# Altium footprint library BARKO_PCBLIB.PcbLib: 531 footprints (part 9 of 34)
Each footprint in its own frame and in the unit in brackets; x right, y up, seen from the top. Pads: shape width x height; smd on the part's side, far side on the other; paste and mask are expansions set on the pad; w line width, h text height; cw(c..) or ccw(c..) is an arc to the next point about the centre after c.
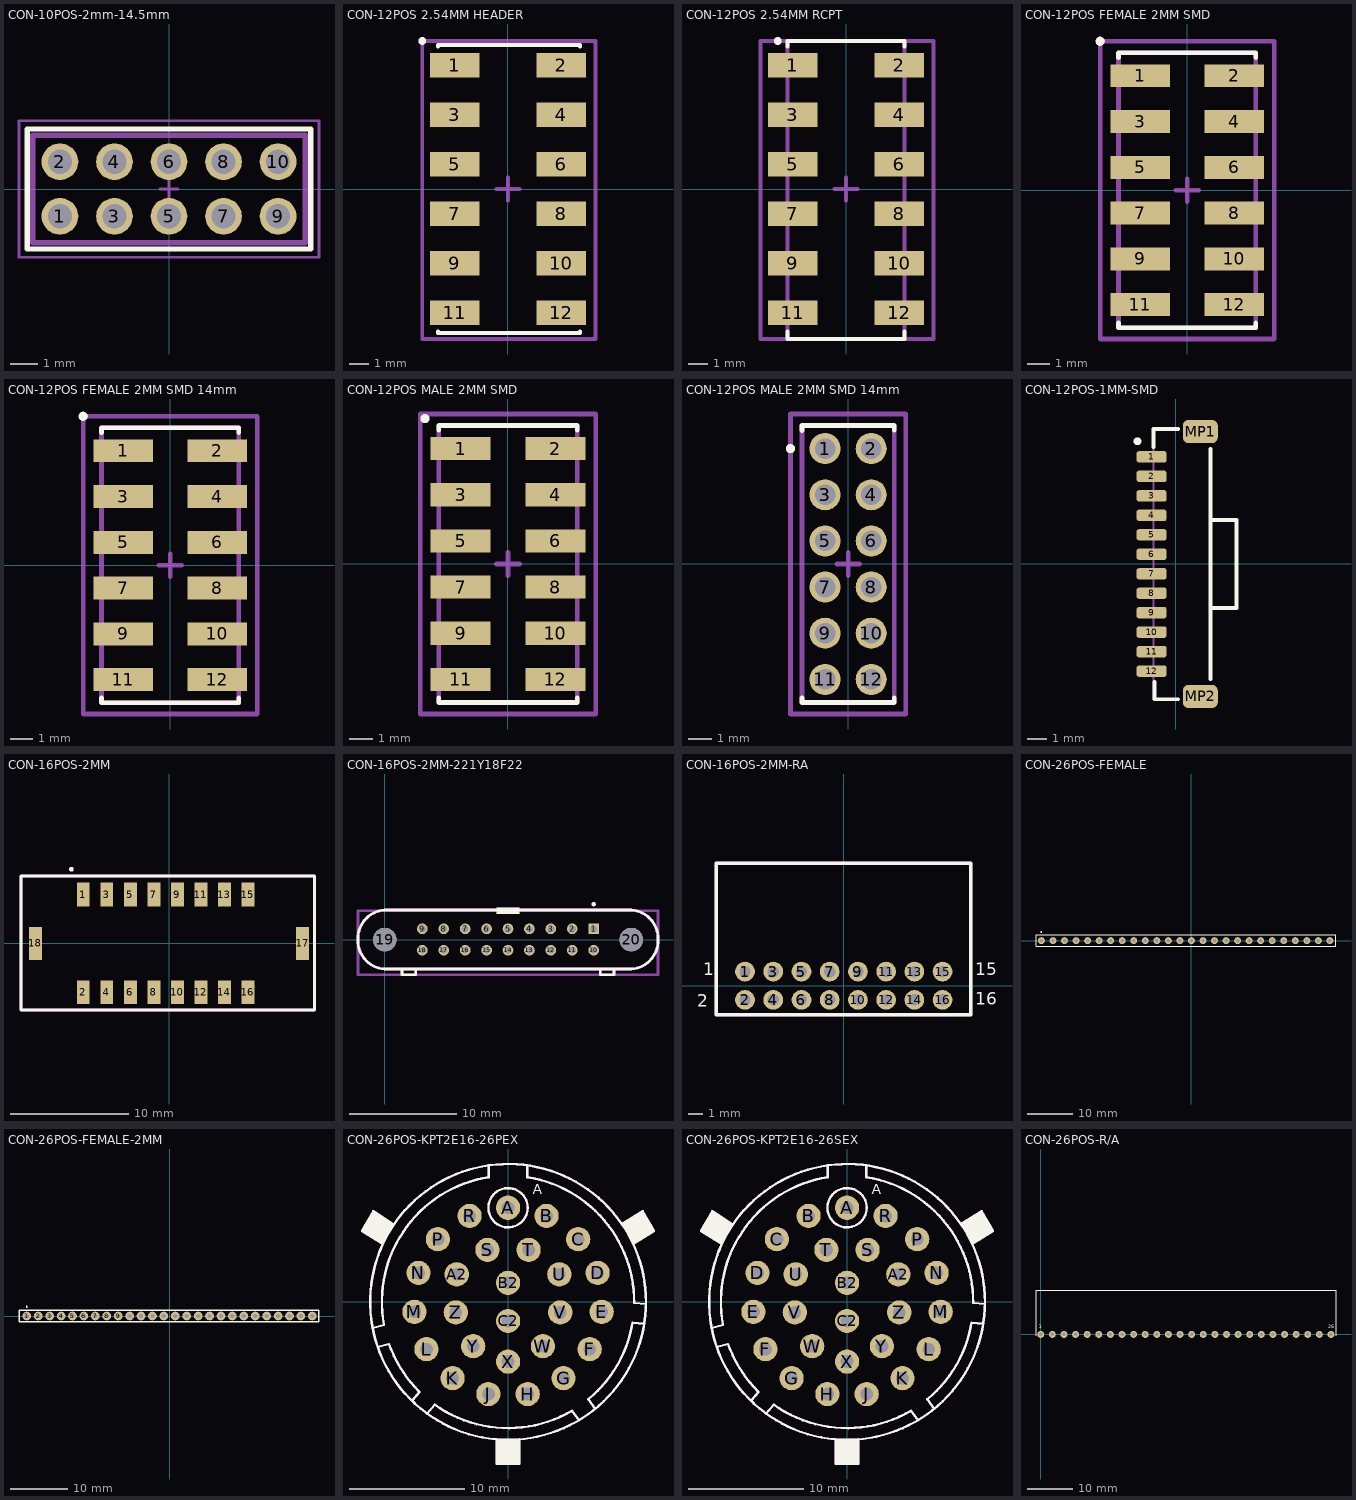
[diagram p8: the footprints below, top view; thin cyan lines are the x and y axes]

## CON-10POS-2mm-14.5mm [mil]
pads (10):
  round 53 hole 35 mask+3: 1(-157.48,-39.37) 2(-157.48,39.37) 3(-78.74,-39.37) 4(-78.74,39.37) 5(0,-39.37) 6(0,39.37) 7(78.74,-39.37) 8(78.74,39.37) 9(157.48,-39.37) 10(157.48,39.37)
Top Overlay:
  lines w7.87: -204.72,-86.61 -204.72,86.61 204.72,86.61 204.72,-86.61 -204.72,-86.61
Mechanical 15:
  lines w3.94: -12.87,0 12.87,0 ; 0,-12.87 0,12.87 ; -216.54,-98.43 -216.54,98.43 216.54,98.43 216.54,-98.43 -216.54,-98.43
ASM Top:
  lines w7.87: -196.85,-77.5 -196.85,77.5 196.85,77.5 196.85,-77.5 -196.85,-77.5
  text ".designator" at -3.94,0 h47.24
3D body "MTMM-105-14-L-D-571.stp": height 630.5, standoff -120.5, extent -196.86,-77.5 196.84,77.5

## CON-12POS 2.54MM HEADER [mm]
pads (12):
  rect 2.54x1.27 smd paste-0.05: 1(-2.73,6.35) 2(2.73,6.35) 3(-2.73,3.81) 4(2.73,3.81) 5(-2.73,1.27) 6(2.73,1.27) 7(-2.73,-1.27) 8(2.73,-1.27) 9(-2.73,-3.81) 10(2.73,-3.81) 11(-2.73,-6.35) 12(2.73,-6.35)
Top Overlay:
  circle w0.2: c-4.4,7.6 r0.1
  lines w0.2: -3.6,-7.3 -3.6,-7.4 3.7,-7.4 3.7,-7.3 ; -3.6,7.3 -3.6,7.4 ; -3.6,7.35 -3.6,7.4 ; 3.7,7.3 3.7,7.4 -3.6,7.4
Mechanical 15:
  lines w0.2: -0.6,0 0,0 ; 0,-0.6 0,0 ; 0,0.6 0,0 ; 0.6,0 0,0 ; -4.4,-7.7 -4.4,7.6 4.5,7.6 4.5,-7.7 -4.4,-7.7
ASM Top:
  lines w0.2: -4.4,-7.7 -4.4,7.6 4.5,7.6 4.5,-7.7 -4.4,-7.7
  text ".designator" at 0.2,-2.1 h0.8
3D body "95278_y01_12_asm.stp": height 9.67, standoff 0.01, extent -3.6,-7.42 3.686,7.42

## CON-12POS 2.54MM RCPT [mm]
pads (12):
  rect 2.54x1.27 smd paste-0.05: 1(-2.73,6.35) 2(2.73,6.35) 3(-2.73,3.81) 4(2.73,3.81) 5(-2.73,1.27) 6(2.73,1.27) 7(-2.73,-1.27) 8(2.73,-1.27) 9(-2.73,-3.81) 10(2.73,-3.81) 11(-2.73,-6.35) 12(2.73,-6.35)
Top Overlay:
  circle w0.2: c-3.5,7.6 r0.1
  lines w0.2: -3,-7.3 -3,-7.7 3,-7.7 3,-7.3 ; -3,7.3 -3,7.6 3,7.6 3,7.3
Mechanical 15:
  lines w0.2: -0.6,0 0,0 ; 0,-0.6 0,0 ; 0,0.6 0,0 ; 0.6,0 0,0 ; -4.4,-7.7 4.5,-7.7 4.5,7.6 -4.4,7.6 -4.4,-7.7
ASM Top:
  circle w0.2: c-3.5,7.6 r0.1
  lines w0.2: -3,-7.7 3,-7.7 3,7.6 -3,7.6 -3,-7.7
  text ".designator" at 0.2,-2.1 h0.8
3D body "89898-306a_asm.stp": height 8.21, standoff 0.01, extent -3.016,-7.63 3.016,7.53

## CON-12POS FEMALE 2MM SMD [mm]
pads (12):
  rect 2.6x1 smd: 1(-2.05,5) 2(2.05,5) 3(-2.05,3) 4(2.05,3) 5(-2.05,1) 6(2.05,1) 7(-2.05,-1) 8(2.05,-1) 9(-2.05,-3) 10(2.05,-3) 11(-2.05,-5) 12(2.05,-5)
Top Overlay:
  circle w0.2: c-3.799,6.507 r0.1
  lines w0.2: -3,-5.8 -3,-6 -2.15,-6 3,-6 3,-5.8 ; -3,5.8 -3,6 2.15,6 3,6 3,5.8
Mechanical 15:
  lines w0.2: -0.5,0 0.5,0 ; 0,-0.5 0,0.5 ; -3.8,-6.5 -3.8,6.5 3.8,6.5 3.8,-6.5 -3.8,-6.5
ASM Top:
  lines w0.2: -3,-6 3,-6 3,6 -3,6 -3,-6
  text ".designator" at -0.1,-0.1 h0.8
3D body "55510-x12_asm.stp": height 5.59, standoff 0.19, extent -3,-5.96 3,5.96

## CON-12POS FEMALE 2MM SMD 14mm [mm]
pads (12):
  rect 2.6x1 smd: 1(-2.05,5) 2(2.05,5) 3(-2.05,3) 4(2.05,3) 5(-2.05,1) 6(2.05,1) 7(-2.05,-1) 8(2.05,-1) 9(-2.05,-3) 10(2.05,-3) 11(-2.05,-5) 12(2.05,-5)
Top Overlay:
  circle w0.2: c-3.799,6.507 r0.1
  lines w0.2: -3,-5.8 -3,-6 -2.15,-6 3,-6 3,-5.8 ; -3,5.8 -3,6 2.15,6 3,6 3,5.8
Mechanical 15:
  lines w0.2: -0.5,0 0.5,0 ; 0,-0.5 0,0.5 ; -3.8,-6.5 -3.8,6.5 3.8,6.5 3.8,-6.5 -3.8,-6.5
ASM Top:
  lines w0.2: -3,-6 3,-6 3,6 -3,6 -3,-6
  text ".designator" at -0.1,-0.1 h0.8
3D body "c-1-2314844-2-5-3d.stp": height 4.63, standoff -0.05, extent -3.33,-6 3.33,6

## CON-12POS MALE 2MM SMD [mm]
pads (12):
  rect 2.6x1 smd: 1(-2.05,5) 2(2.05,5) 3(-2.05,3) 4(2.05,3) 5(-2.05,1) 6(2.05,1) 7(-2.05,-1) 8(2.05,-1) 9(-2.05,-3) 10(2.05,-3) 11(-2.05,-5) 12(2.05,-5)
Top Overlay:
  circle w0.2: c-3.599,6.3 r0.1
  lines w0.2: -3,-5.8 -3,-6 -2.15,-6 3,-6 3,-5.8 ; -3,5.8 -3,6 2.15,6 3,6 3,5.8
Mechanical 15:
  lines w0.2: -0.5,0 0.5,0 ; 0,-0.5 0,0.5 ; -3.8,-6.5 -3.8,6.5 3.8,6.5 3.8,-6.5 -3.8,-6.5
ASM Top:
  lines w0.2: -3,-6 3,-6 3,6 -3,6 -3,-6
  text ".designator" at -0.1,-0.1 h0.8
3D body "57202-G52-06LFc.stp": height 6.51, standoff 0.01, extent -3.002,-6 3.003,6

## CON-12POS MALE 2MM SMD 14mm [mil]
pads (12):
  round 53 hole 35 mask+3: 1(-39.37,196.85) 2(39.37,196.85) 3(-39.37,118.11) 4(39.37,118.11) 5(-39.37,39.37) 6(39.37,39.37) 7(-39.37,-39.37) 8(39.37,-39.37) 9(-39.37,-118.11) 10(39.37,-118.11) 11(-39.37,-196.85) 12(39.37,-196.85)
Top Overlay:
  circle w7.87: c-98.43,196.85 r3.94
  lines w7.87: -78.74,-228.35 -78.74,-236.22 78.74,-236.22 78.74,-228.35 ; -78.74,227.12 -78.74,235 ; -78.74,236.22 78.74,236.22 78.74,228.35
Mechanical 15:
  lines w7.87: -19.68,0 19.68,0 ; 0,-19.68 0,19.68 ; -98.43,-255.91 -98.43,255.9 98.43,255.9 98.43,-255.91 -98.43,-255.91
ASM Top:
  lines w7.87: -78.74,-236.22 78.74,-236.22 78.74,236.22 -78.74,236.22 -78.74,-236.22
  text ".designator" at -3.94,-3.94 h31.5
3D body "MTMM-106-14-T-D-570.stp": height 629.5, standoff -121.5, extent -77.49,-236.21 77.51,236.23

## CON-12POS-1MM-SMD [mm]
pads (14):
  rrect50% 1.55x0.6 smd mask+0.05: 1(-1.25,5.5) 2(-1.25,4.5) 3(-1.25,3.5) 4(-1.25,2.5) 5(-1.25,1.5) 6(-1.25,0.5) 7(-1.25,-0.5) 8(-1.25,-1.5) 9(-1.25,-2.5) 10(-1.25,-3.5) 11(-1.25,-4.5) 12(-1.25,-5.5)
  rrect50% 1.8x1.2 smd mask+0.05: MP1(1.25,6.8) MP2(1.25,-6.8)
Top Overlay:
  circle w0.2: c-1.98,6.3 r0.1
  lines w0.2: -1.16,6.01 -1.16,6.931 0.1,6.931 ; -1.102,-6.048 -1.102,-6.941 0.1,-6.941 ; 1.781,-5.9 1.781,-2.25 ; 1.781,5.9 1.781,2.25 ; 1.781,-2.25 3.11,-2.25 3.11,2.25 1.781,2.25 ; 1.781,-2.25 1.781,-2.25 ; 1.781,-2.25 1.781,2.25
ASM Top:
  lines w0.1: 0.1,-6.941 -1.16,-6.941 -1.16,6.01 -1.16,6.931 0.1,6.931 ; 1.781,-2.25 3.11,-2.25 ; 1.781,2.25 3.11,2.25 3.11,-2.25 ; 1.781,5.9 1.781,-5.9 ; 1.781,-5.9 1.781,-5.9 ; 3.11,-2.25 3.11,-2.25
  text ".designator" at 0.1,0 h0.8
3D body "5013311207.stp": height 5.5, standoff -0.04, extent -1.76,-7.12 3.59,7.12

## CON-16POS-2MM [mm]
pads (18):
  rect 1.1x2 smd: 1(-7.29,4.15) 2(-7.29,-4.15) 3(-5.29,4.15) 4(-5.29,-4.15) 5(-3.29,4.15) 6(-3.29,-4.15) 7(-1.29,4.15) 8(-1.29,-4.15) 9(0.71,4.15) 10(0.71,-4.15) 11(2.71,4.15) 12(2.71,-4.15) 13(4.71,4.15) 14(4.71,-4.15) 15(6.71,4.15) 16(6.71,-4.15)
  rect 1.1x2.8 smd: 17(11.35,0) 18(-11.35,0)
Top Overlay:
  circle w0.2: c-8.299,6.3 r0.1
  lines w0.254: -12.573,-5.664 -12.573,5.715 12.37,5.715 12.37,-5.664 -12.573,-5.664
ASM Top:
  lines w0.254: -12.573,-5.664 -12.573,5.715 12.37,5.715 12.37,-5.664 -12.573,-5.664
  text ".designator" at -8.001,-0.178 h0.8
3D body "DF11G-16DP-2V.stp": height 7.16, standoff -1.04, extent -12.118,-4.496 11.582,4.704

## CON-16POS-2MM-221Y18F22 [mm] "Nicomatic 221Y18F22"
height 5.6
pads (20):
  rect 1x1 hole 0.65: 1(19.5,1)
  round 1 hole 0.65: 2(17.5,1) 3(15.5,1) 4(13.5,1) 5(11.5,1) 6(9.5,1) 7(7.5,1) 8(5.5,1) 9(3.5,1) 10(19.5,-1) 11(17.5,-1) 12(15.5,-1) 13(13.5,-1) 14(11.5,-1) 15(9.5,-1) 16(7.5,-1) 17(5.5,-1) 18(3.5,-1)
  round 2.2 hole 2.2 unplated: 19(0,0) 20(23,0)
Top Overlay:
  circle w0.2: c19.501,3.3 r0.1
  rectangle: 10.438,2.4 12.585,3
  lines w0.254: 1.6,-2.75 1.6,-3.3 2.9,-3.3 2.9,-2.75 ; 20.1,-2.75 20.1,-3.3 21.4,-3.3 21.4,-2.75 ; -2.5,0 ccw(c0.125,-0.125) 0,-2.75 23,-2.75 ccw(c22.875,-0.125) 25.5,0 ccw(c22.875,0.125) 23,2.75 0,2.75 ccw(c0.125,0.125) -2.5,0
Mechanical 15:
  lines w0.254: -2.5,-3.3 -2.5,2.7 25.5,2.7 25.5,-3.3 -2.5,-3.3
ASM Top:
  rectangle: 10.438,2.4 12.585,3
  lines w0.254: 1.6,-2.75 1.6,-3.3 2.9,-3.3 2.9,-2.75 ; 20.1,-2.75 20.1,-3.3 21.4,-3.3 21.4,-2.75 ; -2.5,0 cw(c0.125,0.125) 0,2.75 23,2.75 cw(c22.875,0.125) 25.5,0 cw(c22.875,-0.125) 23,-2.75 0,-2.75 cw(c0.125,-0.125) -2.5,0
  text ".designator" at 9.1,-0.2 h0.8
3D body "221Y18F22.STEP": height 5.8, standoff -4.8, extent -2.499,-3.271 25.501,2.729

## CON-16POS-2MM-RA [mm]
pads (16):
  round 1.4 hole 0.8: 1(-7,1) 2(-7,-1) 3(-5,1) 4(-5,-1) 5(-3,1) 6(-3,-1) 7(-1,1) 8(-1,-1) 9(1,1) 10(1,-1) 11(3,1) 12(3,-1) 13(5,1) 14(5,-1) 15(7,1) 16(7,-1)
Top Overlay:
  lines w0.254: -9.032,-2.048 9.002,-2.048 9.002,8.671 -9.032,8.671 -9.032,-2.048
  text "1" at -9.946,0.416 h1.52
  text "2" at -10.404,-1.794 h1.52
  text "15" at 9.332,0.416 h1.52
  text "16" at 9.332,-1.667 h1.52
ASM Top:
  lines w0.254: -9.032,-2.048 -9.032,8.671 9.002,8.671 9.002,-2.048 -9.032,-2.048
  text ".designator" at -7.889,3.134 h0.8
3D body "DF11-16DPOS-2DS-RA.stp": height 5.16, standoff -2.84, extent -9.007,-1.337 8.993,8.663

## CON-26POS-FEMALE [mil]
pads (26):
  round 60 hole 30: 1(-1300,0) 2(-1200,0) 3(-1100,0) 4(-1000,0) 5(-900,0) 6(-800,0) 7(-700,0) 8(-600,0) 9(-500,0) 10(-400,0) 11(-300,0) 12(-200,0) 13(-100,0) 14(0,0) 15(100,0) 16(200,0) 17(300,0) 18(400,0) 19(500,0) 20(600,0) 21(700,0) 22(800,0) 23(900,0) 24(1000,0) 25(1100,0) 26(1200,0)
Top Overlay:
  circle w7.87: c-1300,74.8 r3.94
  lines w10: -1347.24,-50 -1347.24,50 1252.76,50 1252.76,-50 -1347.24,-50
3D body "SS-126-TT-2.stp": height 175.87, standoff -124.13, extent -1347.24,-50 1252.76,50

## CON-26POS-FEMALE-2MM [mil]
pads (26):
  round 60 hole 30: 1(-984.25,0) 2(-905.51,0) 3(-826.77,0) 4(-748.03,0) 5(-669.29,0) 6(-590.55,0) 7(-511.81,0) 8(-433.07,0) 9(-354.33,0) 10(-275.59,0) 11(-196.85,0) 12(-118.11,0) 13(-39.37,0) 14(39.37,0) 15(118.11,0) 16(196.85,0) 17(275.59,0) 18(354.33,0) 19(433.07,0) 20(511.81,0) 21(590.55,0) 22(669.29,0) 23(748.03,0) 24(826.77,0) 25(905.51,0) 26(984.25,0)
Top Overlay:
  circle w7.87: c-984.25,62.99 r3.94
  lines w10: -1038.04,-39.35 1030.15,-39.35 1030.15,39.35 -1038.04,39.35 -1038.04,-39.35
3D body "MMS-126-01-F-SV.stp": height 175, standoff -115, extent -1038.04,-39.35 1030.15,39.35

## CON-26POS-KPT2E16-26PEX [mm]
pads (26):
  round 2.1 hole 1.1: A(0,8.15) A2(-4.44,2.39) B(3.33,7.44) B2(0,1.65) C(6.07,5.43) C2(0,-1.65) D(7.75,2.51) E(8.1,-0.86) F(7.06,-4.09) G(4.8,-6.6) H(1.7,-7.97) J(-1.7,-7.97) K(-4.8,-6.6) L(-7.06,-4.09) M(-8.1,-0.86) N(-7.75,2.51) P(-6.07,5.43) R(-3.33,7.44) S(-1.78,4.5) T(1.78,4.5) U(4.44,2.39) V(4.52,-0.91) W(3.02,-3.83) X(0,-5.16) Y(-3.02,-3.83) Z(-4.52,-0.91)
Top Overlay:
  circle w0.2: c0,0 r11.934
  circle w0.2: c0,8.15 r1.7
  region: -0.994,-11.893 -0.994,-14.025 0.986,-14.025 0.994,-11.893
  region: 11.647,7.87 9.844,6.748 10.823,5.029 12.637,6.155
  region: -11.655,7.87 -12.645,6.155 -10.823,5.029 -9.89,6.679
  lines w0.2: -11.718,-2.254 -10.74,-1.992 ; -11.277,-3.906 -10.296,-3.644 ccw(c0,0) -7.655,-7.79 -8.308,-8.566 ; -10.823,5.029 -12.645,6.155 -11.655,7.87 -9.89,6.679 ; -10.733,-1.991 cw(c0.005,0) -1.66,10.794 -1.66,11.815 ; -6.997,-9.665 -6.345,-8.889 ccw(c0,0) 5.542,-9.41 ; -0.994,-11.893 -0.994,-14.025 0.986,-14.025 0.994,-11.893 ; 1.65,10.791 cw(c0,0) 10.916,-0.097 11.924,-0.185 ; 1.65,10.794 1.65,11.815 ; 5.541,-9.408 6.12,-10.238 ; 7.521,-9.257 6.941,-8.427 ccw(c0,0) 10.77,-1.789 ; 9.844,6.748 11.647,7.87 12.637,6.155 10.823,5.029 ; 10.767,-1.801 11.775,-1.889
  text "A" at 2.134,9.017 h1.5
ASM Top:
  circle w0.2: c0,8.15 r1.7
  circle w0.2: c0,0 r11.934
  region: -11.655,7.87 -12.645,6.155 -10.823,5.029 -9.89,6.679
  region: 11.647,7.87 9.844,6.748 10.823,5.029 12.637,6.155
  region: -0.994,-11.893 -0.994,-14.025 0.986,-14.025 0.994,-11.893
  lines w0.2: -11.718,-2.254 -10.74,-1.992 ; -11.277,-3.906 -10.296,-3.644 ccw(c0,0) -7.655,-7.79 -8.308,-8.566 ; -10.823,5.029 -12.645,6.155 -11.655,7.87 -9.89,6.679 ; -10.733,-1.991 cw(c0.005,0) -1.66,10.794 -1.66,11.815 ; -6.997,-9.665 -6.345,-8.889 ccw(c0,0) 5.542,-9.41 ; -0.994,-14.025 -0.994,-11.893 ; 0.986,-14.025 0.994,-11.893 ; 1.65,10.791 cw(c0,0) 10.916,-0.097 11.924,-0.185 ; 1.65,10.794 1.65,11.815 ; 5.541,-9.408 6.12,-10.238 ; 7.521,-9.257 6.941,-8.427 ccw(c0,0) 10.77,-1.789 ; 9.844,6.748 11.647,7.87 12.637,6.155 10.823,5.029 ; 10.767,-1.801 11.775,-1.889
  text ".designator" at -0.7,-0.2 h0.8
  text "A" at 2.134,9.017 h1.5
3D body "KPT2E1626PEX.stp": height 24, standoff -5.77, extent -15.449,-15.445 15.451,15.445

## CON-26POS-KPT2E16-26SEX [mm]
pads (26):
  round 2.1 hole 1.1: A(0,8.15) A2(4.44,2.39) B(-3.33,7.44) B2(0,1.65) C(-6.07,5.43) C2(0,-1.65) D(-7.75,2.51) E(-8.1,-0.86) F(-7.06,-4.09) G(-4.8,-6.6) H(-1.7,-7.97) J(1.7,-7.97) K(4.8,-6.6) L(7.06,-4.09) M(8.1,-0.86) N(7.75,2.51) P(6.07,5.43) R(3.33,7.44) S(1.78,4.5) T(-1.78,4.5) U(-4.44,2.39) V(-4.52,-0.91) W(-3.02,-3.83) X(0,-5.16) Y(3.02,-3.83) Z(4.52,-0.91)
Top Overlay:
  circle w0.2: c0,0 r11.934
  circle w0.2: c0,8.15 r1.7
  region: -0.994,-11.893 -0.994,-14.025 0.986,-14.025 0.994,-11.893
  region: 11.647,7.87 9.844,6.748 10.823,5.029 12.637,6.155
  region: -11.655,7.87 -12.645,6.155 -10.823,5.029 -9.89,6.679
  lines w0.2: -11.718,-2.254 -10.74,-1.992 ; -11.277,-3.906 -10.296,-3.644 ccw(c0,0) -7.655,-7.79 -8.308,-8.566 ; -10.823,5.029 -12.645,6.155 -11.655,7.87 -9.89,6.679 ; -10.733,-1.991 cw(c0.005,0) -1.66,10.794 -1.66,11.815 ; -6.997,-9.665 -6.345,-8.889 ccw(c0,0) 5.542,-9.41 ; -0.994,-11.893 -0.994,-14.025 0.986,-14.025 0.994,-11.893 ; 1.65,10.791 cw(c0,0) 10.916,-0.097 11.924,-0.185 ; 1.65,10.794 1.65,11.815 ; 5.541,-9.408 6.12,-10.238 ; 7.521,-9.257 6.941,-8.427 ccw(c0,0) 10.77,-1.789 ; 9.844,6.748 11.647,7.87 12.637,6.155 10.823,5.029 ; 10.767,-1.801 11.775,-1.889
  text "A" at 2.134,9.017 h1.5
ASM Top:
  circle w0.2: c0,8.15 r1.7
  circle w0.2: c0,0 r11.934
  region: -11.655,7.87 -12.645,6.155 -10.823,5.029 -9.89,6.679
  region: 11.647,7.87 9.844,6.748 10.823,5.029 12.637,6.155
  region: -0.994,-11.893 -0.994,-14.025 0.986,-14.025 0.994,-11.893
  lines w0.2: -11.718,-2.254 -10.74,-1.992 ; -11.277,-3.906 -10.296,-3.644 ccw(c0,0) -7.655,-7.79 -8.308,-8.566 ; -10.823,5.029 -12.645,6.155 -11.655,7.87 -9.89,6.679 ; -10.733,-1.991 cw(c0.005,0) -1.66,10.794 -1.66,11.815 ; -6.997,-9.665 -6.345,-8.889 ccw(c0,0) 5.542,-9.41 ; -0.994,-14.025 -0.994,-11.893 ; 0.986,-14.025 0.994,-11.893 ; 1.65,10.791 cw(c0,0) 10.916,-0.097 11.924,-0.185 ; 1.65,10.794 1.65,11.815 ; 5.541,-9.408 6.12,-10.238 ; 7.521,-9.257 6.941,-8.427 ccw(c0,0) 10.77,-1.789 ; 9.844,6.748 11.647,7.87 12.637,6.155 10.823,5.029 ; 10.767,-1.801 11.775,-1.889
  text ".designator" at -1.245,-0.127 h0.8
  text "A" at 2.134,9.017 h1.5
3D body "KPT2E1626SEX.stp": height 24, standoff -5.94, extent -15.449,-15.445 15.451,15.445

## CON-26POS-R/A [mil]
pads (26):
  round 60 hole 30: 1(0,0) 2(100,0) 3(200,0) 4(300,0) 5(400,0) 6(500,0) 7(600,0) 8(700,0) 9(800,0) 10(900,0) 11(1000,0) 12(1100,0) 13(1200,0) 14(1300,0) 15(1400,0) 16(1500,0) 17(1600,0) 18(1700,0) 19(1800,0) 20(1900,0) 21(2000,0) 22(2100,0) 23(2200,0) 24(2300,0) 25(2400,0) 26(2500,0)
Top Overlay:
  lines w10: -40.95,-11.93 -40.95,382.01 2543.31,382.01 ; 2543.31,-11.93 2543.31,382.01 ; 2543.31,382.01 2543.31,382.01
  text "26" at 2476.38,51.18 h32
  text "1" at -15.75,51.18 h32
3D body "26 POS HEADER RA.stp": height 100.02, standoff -97.94, extent -40.95,-11.93 2543.31,382.01